# Altium footprint library 晶体管封装库.PcbLib: 101 footprints (part 2 of 7)
Each footprint in its own frame and in the unit in brackets; x right, y up, seen from the top. Pads: shape width x height; smd on the part's side, far side on the other; paste and mask are expansions set on the pad; w line width, h text height; cw(c..) or ccw(c..) is an arc to the next point about the centre after c.
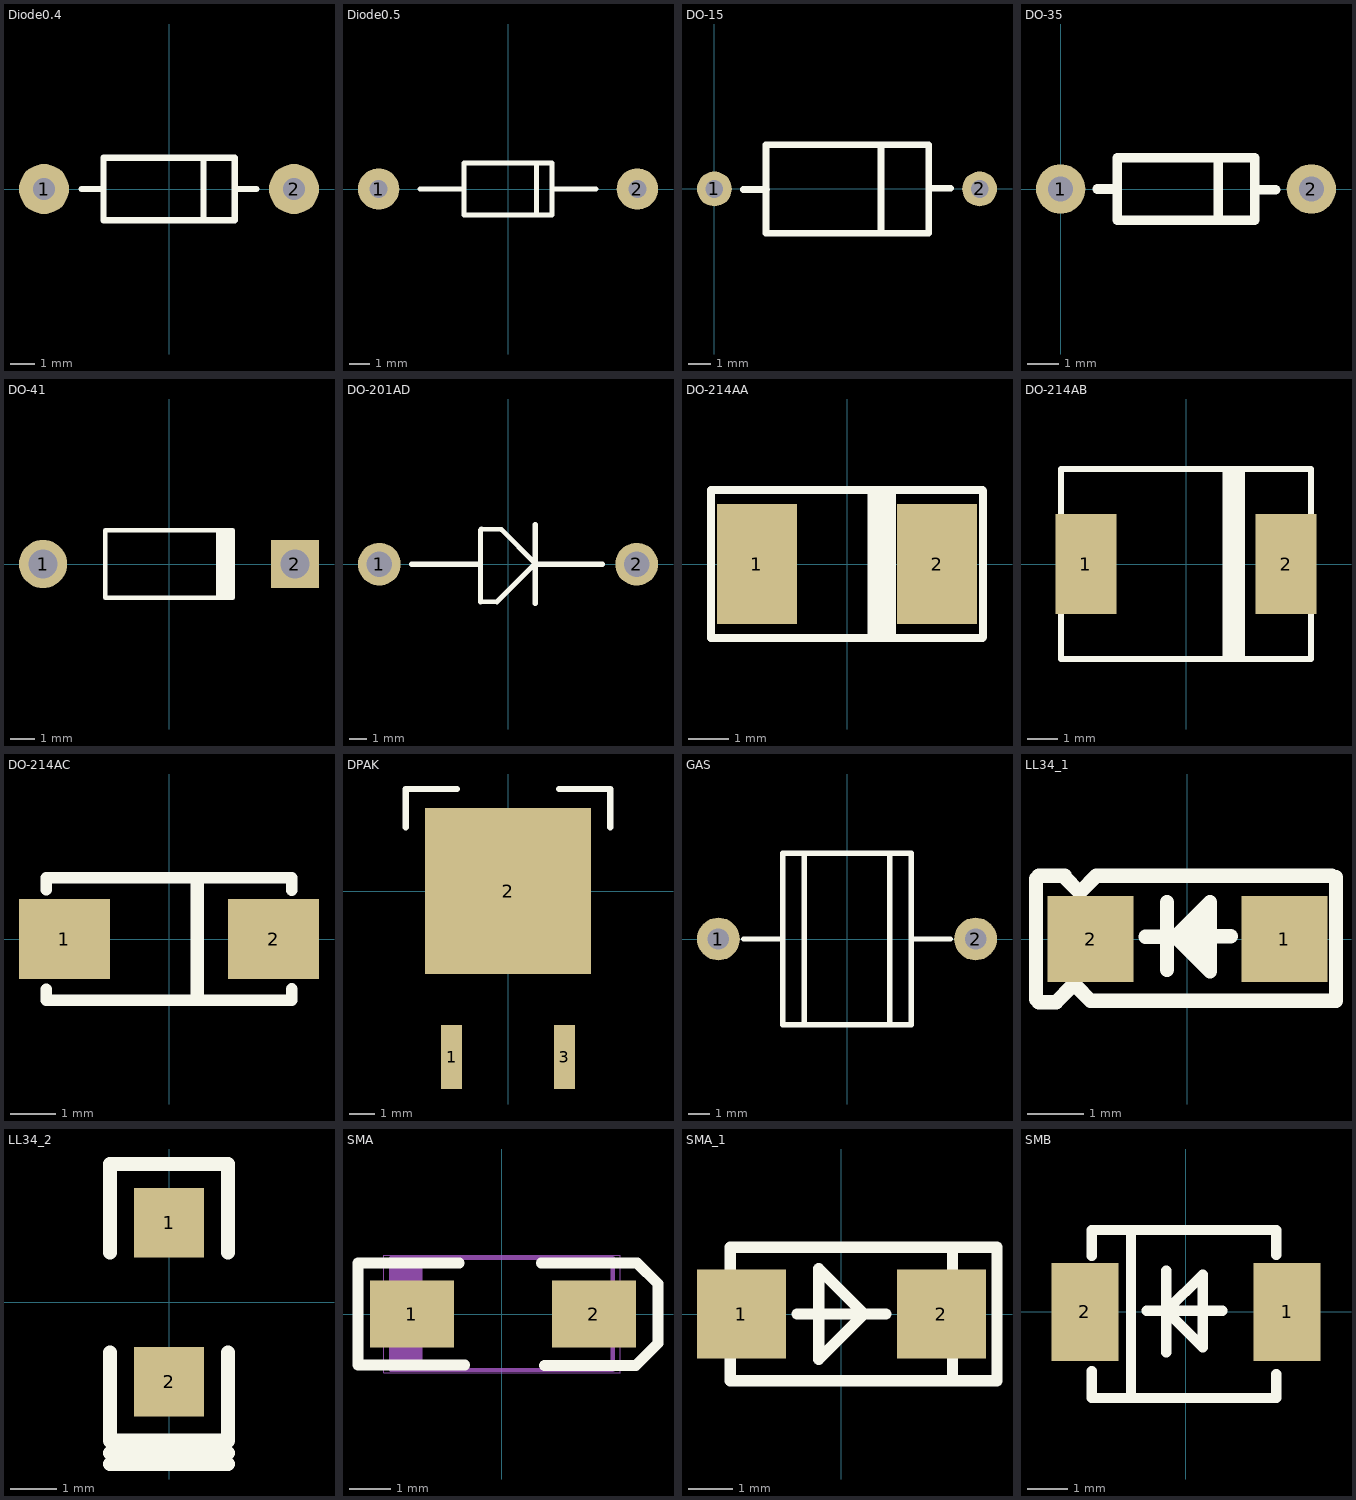
[diagram p1: the footprints below, top view; thin cyan lines are the x and y axes]

## Diode0.4 [mil]
pads (2):
  round 80 hole 35: 1(-200,0) 2(200,0)
Top Overlay:
  lines w10: -140,0 -105,0 ; 55,-50 55,50 ; 105,0 140,0 ; -105,-50 -105,-10 -105,50 105,50 105,-50 -105,-50

## Diode0.5 [mil]
pads (2):
  round 80 hole 35: 1(-250,0) 2(250,0)
Top Overlay:
  lines w10: -170,0 -85,0 ; 55,-50 55,50 ; 85,0 170,0 ; -85,0 -85,50 85,50 85,-50 -85,-50 -85,0

## DO-15 [mil]
pads (2):
  round 62 hole 31.5: 1(0,0) 2(472.44,0)
Top Overlay:
  lines w12: 51.18,-1 93,-1 ; 92,-78.74 381.89,-78.74 ; 92,-78 92,78.48 ; 92,78.74 381.89,78.74 ; 297,-78.74 297,78.74 ; 382,-79 382,78.48 ; 388,1 421.26,1

## DO-35 [mil]
pads (2):
  round 62 hole 31.5: 1(0,0) 2(314.96,0)
Top Overlay:
  lines w12: 46,0 71,0 ; 198,-39.37 198,39.37 ; 245,-1 270,-1 ; 71,-39.37 71,39.37 244,39.37 244,-39.37 71,-39.37

## DO-41 [mm] "Diode, Axial; Body 5.2 x 2.7 mm (LxDia. max), Lead Dia. 0.86 mm (max)"
height 2.8
pads (2):
  round 2 hole 1.2: 1(-5.23,0)
  rect 2x2 hole 1.2: 2(5.23,0)
Top Overlay:
  rectangle: 1.95,-1.4 2.75,1.4
  lines w0.2: 2.65,-1.4 -2.65,-1.4 -2.65,1.4 2.65,1.4

## DO-201AD [mm]
pads (2):
  round 2.5 hole 1.5: 1(-7.544,0) 2(7.544,0)
Top Overlay:
  lines w0.254: -1.61,-2.2 -0.651,-2.2 ; -1.549,2.057 -0.406,2.057
  lines w0.3: -1.61,-2.2 -1.61,1.997 -1.549,2.057 ; -0.651,-2.2 1.549,0 ; -0.394,2.045 1.575,0.076
  lines w0.305: -5.644,0 -1.702,0 ; 1.6,-2.289 1.6,2.311 ; 1.626,0 5.537,0
3D body: height 7.6, standoff -4, extent -8.229,-2.933 8.331,2.667

## DO-214AA [mm]
pads (2):
  rect 2x3 smd: 1(-2.25,0) 2(2.25,0)
Top Overlay:
  lines w0.2: -3.4,-1.854 -3.4,1.854 ; -3.389,-1.85 3.389,-1.85 ; -3.389,1.85 3.389,1.85 ; 3.4,-1.829 3.4,1.829
  lines w0.203: 0.61,-1.778 0.61,1.829 ; 1.118,-1.803 1.118,1.829
  lines w0.254: 0.838,-1.803 0.838,1.829 ; 0.991,-1.803 0.991,1.803
3D body: height 2.32, standoff 0.02, extent -2.7,-1.771 2.7,1.829

## DO-214AB [mm]
pads (2):
  rect 2x3.27 smd: 1(-3.29,0) 2(3.29,0)
Top Overlay:
  lines w0.2: -4.1,-3.12 4.1,-3.12 ; -4.1,-3.048 -4.1,3.048 ; -4.1,3.12 4.1,3.12 ; 4.1,-3.048 4.1,3.048
  lines w0.254: 1.321,3.099 1.321,-3.048 1.346,-3.073 1.346,2.845 1.575,3.073 1.575,-3.023 1.753,-3.023 ; 1.753,-3.023 1.753,2.972 1.803,3.023 1.803,-2.972 1.753,-3.023
3D body: height 2.32, standoff 0.02, extent -3.975,-2.95 3.975,2.95

## DO-214AC [mm]
pads (2):
  rect 2x1.75 smd: 1(-2.3,0) 2(2.3,0)
Top Overlay:
  lines w0.254: -2.7,-1.105 -2.7,-1.35 2.7,-1.35 2.7,-1.1 ; -2.7,1.08 -2.7,1.35 2.695,1.35 ; 2.7,1.075 2.7,1.35
  lines w0.3: 0.62,-1.3 0.62,1.3
3D body: height 2.3, standoff 0.02, extent -2.743,-1.524 2.743,1.27

## DPAK [mil]
pads (3):
  rect 33x100 smd: 1(-88.5,-260) 3(88.5,-260)
  rect 260x260 smd: 2(0,0)
Top Overlay:
  lines w10: -160,100 -160,160 -80,160 ; 80,160 160,160 160,100

## GAS [mm]
pads (2):
  round 2 hole 1: 1(-6,0) 2(6,0)
Top Overlay:
  lines w0.254: -4.826,0 -3,0 ; -2,-4 -2,4 ; 2,-4 2,4 ; 3,0 4.826,0 ; -3,-4 -3,4 3,4 3,-4 -3,-4

## LL34_1 [mil]
pads (2):
  rect 60x60 smd: 1(67.5,0) 2(-67.5,0)
Top Overlay:
  lines w10: -29.25,1.5 -8.25,1.5 ; -14.25,-21.5 -14.25,25.5 ; -14.25,2 30.25,2 ; 9.75,-5.5 0.75,3.5 7.75,-3.5 7.75,17.5 12.75,22.5 14.75,22.5 ; 100.5,44 -63.5,44 -74.5,33 -75.5,33 -85.5,43 -85.5,44 -103.5,44 -105.5,42 -105.5,-42 -103.5,-44 ; 103.5,41 103.5,-43 ; 103.5,43 103.5,-43 ; -103.5,-44 -91.5,-44 ; -103.5,-44 -91.5,-44 ; -91.5,-44 -80.5,-33 -77.5,-33 -67.5,-43 103.5,-43 ; -8.25,1.5 15.75,25.5 15.75,-22.5 -8.25,1.5
3D body: height 58.54, standoff 1.46, extent -66.4,-29.09 71.39,28

## LL34_2 [mm]
pads (2):
  rect 1.5x1.5 smd: 1(0,1.714) 2(0,-1.714)
Top Overlay:
  lines w0.305: -1.27,-3.484 1.27,-3.484 ; -1.27,-3.244 1.27,-3.244 ; -1.27,-1.079 -1.27,-2.984 1.27,-2.984 1.27,-1.079 ; -1.27,1.079 -1.27,2.984 1.27,2.984 1.27,1.079
3D body: height 1.43, standoff -0.02, extent -0.725,-1.75 0.725,1.75

## SMA [mm]
pads (2):
  rect 2x1.6 smd: 1(-2.15,0) 2(2.2,0)
Top Overlay:
  lines w0.254: -1.016,1.22 -3.44,1.22 -3.44,-1.22 -0.889,-1.22 ; 0.94,1.22 3.23,1.22 3.73,0.72 3.73,-0.7 3.2,-1.23 1.016,-1.23
Mechanical 15:
  lines w0.1: -2.548,-1.335 -2.548,1.335 ; -2.448,-1.335 -2.448,1.335 ; -2.348,-1.335 -2.348,1.335 ; -2.248,-1.335 -2.248,1.335 ; -2.148,-1.335 -2.148,1.335 ; -2.047,-1.335 -2.047,1.335 ; -1.948,-1.335 -1.948,1.335 ; -2.648,-1.335 -2.648,1.335 2.648,1.335 2.648,-1.335 -2.648,-1.335
Mechanical 16:
  lines w0.001: -2.83,-1.4 -2.83,1.4 2.83,1.4 2.83,-1.4 -2.83,-1.4
3D body: height 2.44, standoff 0.16, extent -2.743,-1.397 2.743,1.397

## SMA_1 [mm]
height 2
pads (2):
  rect 2x2 smd: 1(-2.25,0) 2(2.25,0)
Top Overlay:
  lines w0.254: -2.5,-1 -2.5,-1.5 2.5,-1.5 ; -2.5,1 -2.5,1.5 2.5,1.5 ; -1,0 1,0 ; 2.5,-1 2.5,-1.5 ; 2.5,1 2.5,1.5 ; 2.5,-1.5 3.5,-1.5 3.5,1.5 2.5,1.5 ; -0.508,-1.016 -0.508,1.016 0.508,0 -0.508,-1.016
3D body: height 2.15, standoff -0.05, extent -2.5,-1.35 2.5,1.35

## SMB [mm] "DO-214AA"
pads (2):
  rect 1.65x2.4 smd: 1(2.475,0) 2(-2.475,0)
Top Overlay:
  lines w0.254: -2.311,-1.448 -2.311,-2.108 2.21,-2.108 2.21,-1.524 ; -2.311,1.372 -2.311,2.007 2.21,2.007 2.21,1.397 ; -1.346,-2.032 -1.346,2.007 ; -0.965,0.025 0.889,0.025 ; -0.483,-0.991 -0.483,1.016 ; -0.483,0.025 0.406,0.914 0.406,-0.864 -0.483,0.025
3D body: height 2.45, standoff 0.03, extent -2.75,-1.975 2.75,1.925